# Altium footprint library c3_PcbLib.PcbLib: 222 footprints (part 9 of 14)
Each footprint in its own frame and in the unit in brackets; x right, y up, seen from the top. Pads: shape width x height; smd on the part's side, far side on the other; paste and mask are expansions set on the pad; w line width, h text height; cw(c..) or ccw(c..) is an arc to the next point about the centre after c.
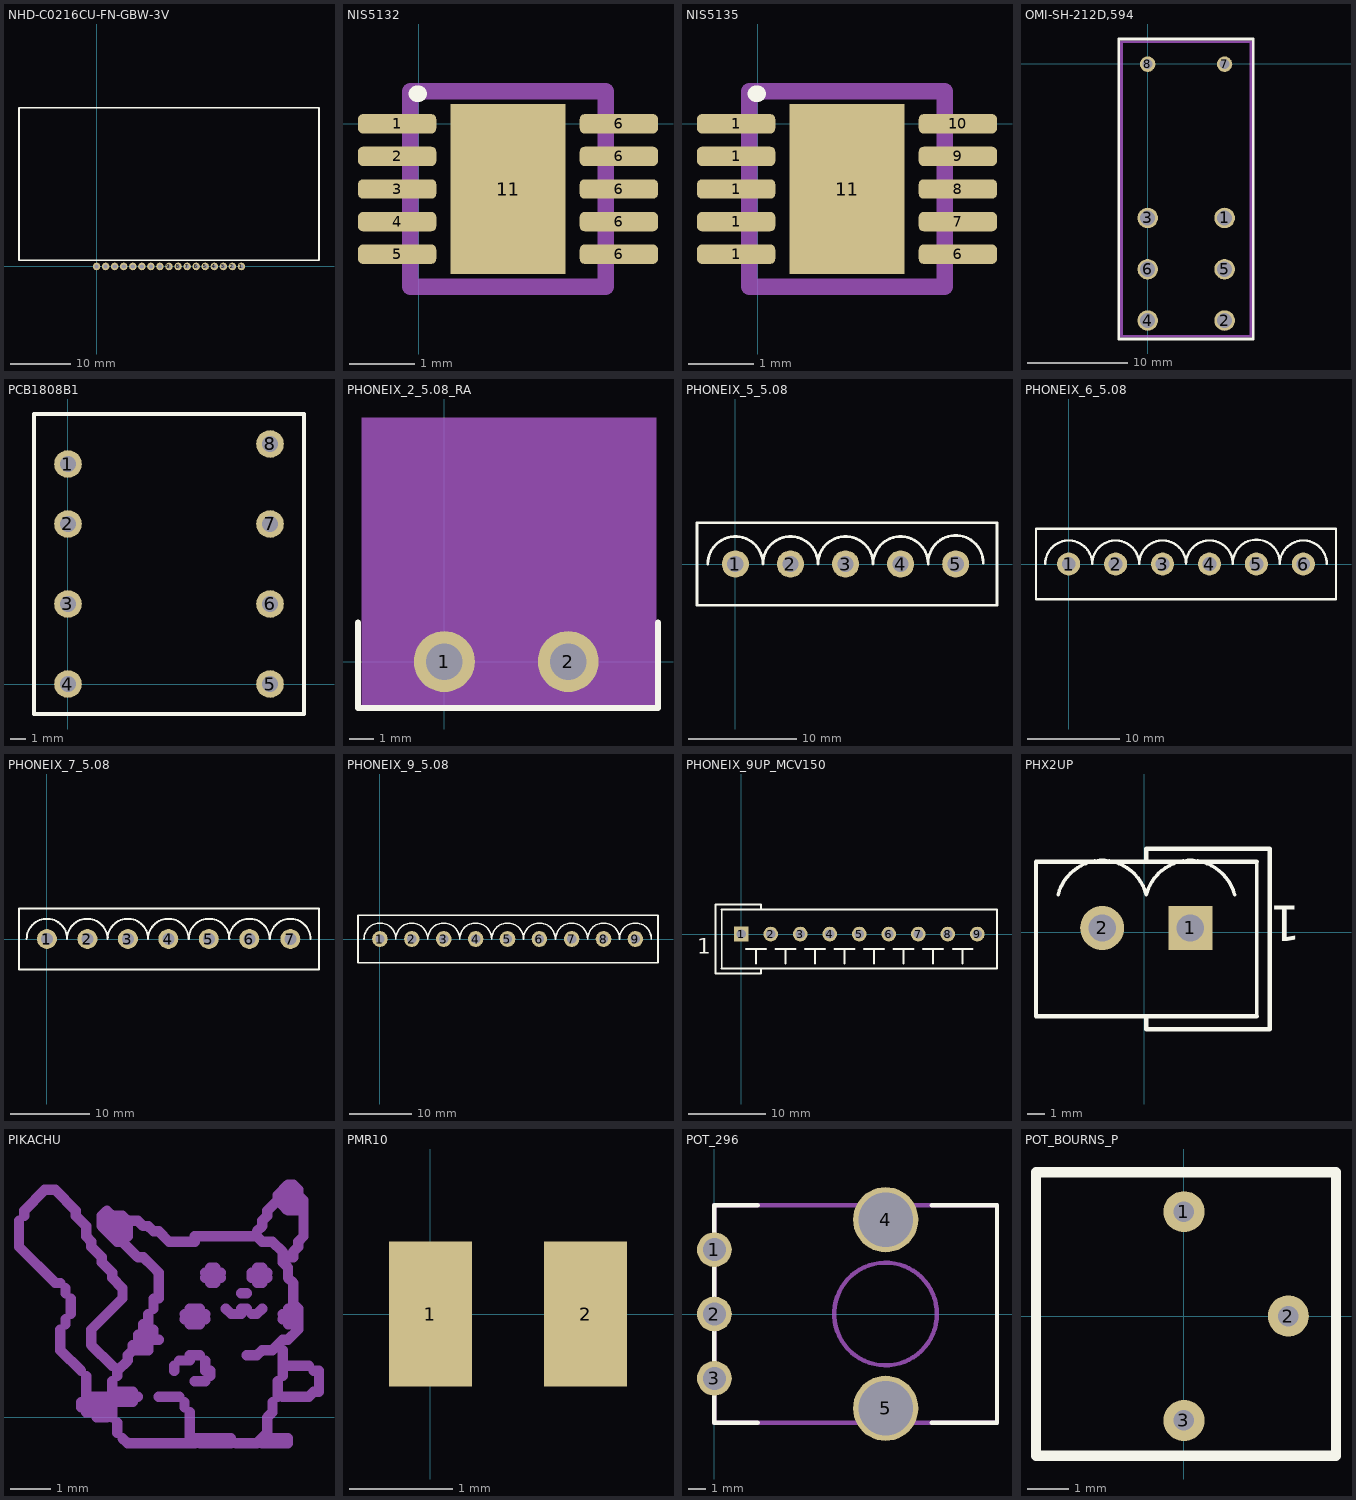
[diagram p8: the footprints below, top view; thin cyan lines are the x and y axes]

## NHD-C0216CU-FN-GBW-3V [mm]
pads (17):
  round 1.25 hole 0.7: 1(24,0) 2(22.5,0) 3(21,0) 4(19.5,0) 5(18,0) 6(16.5,0) 7(15,0) 8(13.5,0) 9(12,0) 10(10.5,0) 11(9,0) 12(7.5,0) 13(6,0) 14(4.5,0) 15(3,0) 16(1.5,0) 17(0,0)
Top Overlay:
  lines w0.254: -12.85,1 36.85,1 36.85,26.3 -12.85,26.3 -12.85,1
3D body: height 2, standoff 0, extent -12.827,1.041 36.83,26.289

## NIS5132 [mm]
pads (11):
  rrect50% 1.2x0.297 smd: 1(-0.33,0) 2(-0.33,-0.5) 3(-0.33,-1) 4(-0.33,-1.5) 5(-0.33,-2) 6(3.07,-2) 6(3.07,-1.5) 6(3.07,-1) 6(3.07,-0.5) 6(3.07,0)
  rect 1.768x2.6 smd: 11(1.37,-1)
Top Overlay:
  lines w0.254: -0.025,0.457 0,0.457
Mechanical 13:
  lines w0.254: -0.13,-2.5 -0.13,0.5 2.87,0.5 2.87,-2.5 -0.13,-2.5
3D body: height 1, standoff 0, extent -0.13,-2.499 2.869,0.499

## NIS5135 [mm]
pads (11):
  rrect50% 1.2x0.297 smd: 1(-0.33,-2) 1(-0.33,-1.5) 1(-0.33,-1) 1(-0.33,-0.5) 1(-0.33,0) 6(3.07,-2) 7(3.07,-1.5) 8(3.07,-1) 9(3.07,-0.5) 10(3.07,0)
  rect 1.768x2.6 smd: 11(1.37,-1)
Top Overlay:
  lines w0.254: -0.025,0.457 0,0.457
Mechanical 13:
  lines w0.254: -0.13,-2.5 2.87,-2.5 2.87,0.5 -0.13,0.5 -0.13,-2.5
3D body: height 1, standoff 0, extent -0.13,-2.499 2.869,0.499

## OMI-SH-212D,594 [mil]
pads (8):
  round 80 hole 59: 1(299.57,-600.99) 2(299.57,-1000.99) 3(-0.43,-600.99) 4(-0.43,-1000.99) 5(299.57,-800.99) 6(-0.43,-800.99)
  round 60 hole 39: 7(299.57,-0.99) 8(-0.43,-0.99)
Top Overlay:
  lines w10: -113.43,-1072.99 411.57,-1072.99 411.57,97.01 -113.43,97.01 -113.43,-1072.99
Mechanical 1:
  lines w10: -102.43,-1062.99 401.57,-1062.99 401.57,87.01 -102.43,87.01 -102.43,-1062.99
3D body: height 0, standoff -157, extent 280.07,-606.99 319.07,-594.99
3D body: height 0, standoff -157, extent 280.07,-806.99 319.07,-794.99
3D body: height 0, standoff -157, extent 280.07,-1006.99 319.07,-994.99
3D body: height 0, standoff -157, extent -19.93,-1006.99 19.07,-994.99
3D body: height 0, standoff -157, extent -19.93,-806.99 19.07,-794.99
3D body: height 0, standoff -157, extent -19.93,-606.99 19.07,-594.99
3D body: height 0, standoff -157, extent 287.58,-12.99 311.58,11.01
3D body: height 0, standoff -157, extent -12.42,-12.99 11.58,11.01
3D body: height 811, standoff 0, extent -102.43,-1062.99 401.57,87.01

## PCB1808B1 [mm]
pads (8):
  round 1.75 hole 1: 1(0,13.97) 2(0,10.16) 3(0,5.08) 4(0,0) 5(12.83,0) 6(12.83,5.08) 7(12.83,10.16) 8(12.83,15.24)
Top Overlay:
  lines w0.254: 15,-1.905 -2.17,-1.905 -2.17,17.145 15,17.145 15,-1.9
3D body: height 15.89, standoff -4.34, extent -1.93,-2.035 14.73,17.2

## PHONEIX_2_5.08_RA [mm]
height 15
pads (2):
  round 2.5 hole 1.5: 1(0,0) 2(5.08,0)
Top Overlay:
  lines w0.254: -3.54,-1.9 -3.54,1.6 ; -3.5,-1.9 8.7,-1.9 ; 8.76,-1.9 8.76,1.6
Mechanical 1:
  rectangle: -3.4,-2 8.7,10

## PHONEIX_5_5.08 [mm]
pads (5):
  round 2.5 hole 1.5: 1(0,0) 2(5.08,0) 3(10.16,0) 4(15.24,0) 5(20.32,0)
Top Overlay:
  lines w0.254: -2.54,0 cw(c0,0) 2.54,0 cw(c5.08,0) 7.62,0 cw(c10.16,0) 12.7,0 cw(c15.24,0) 17.78,0 ; 17.78,0.1 cw(c20.32,0.1) 22.86,0.1 ; -3.54,-3.8 24.13,-3.8 24.13,3.8 -3.54,3.8 -3.54,-3.8
3D body: height 12, standoff -3.9, extent -3.524,-4.815 23.876,3.785

## PHONEIX_6_5.08 [mm]
pads (6):
  round 2.5 hole 1.5: 1(0,0) 2(5.08,0) 3(10.16,0) 4(15.24,0) 5(20.32,0) 6(25.4,0)
Top Overlay:
  lines w0.254: -2.54,0 cw(c0,0) 2.54,0 cw(c5.08,0) 7.62,0 cw(c10.16,0) 12.7,0 cw(c15.24,0) 17.78,0 ; 17.78,0.1 cw(c20.32,0.1) 22.86,0.1 ; 22.86,0 cw(c25.4,0) 27.94,0 ; -3.54,-3.8 -3.54,3.8 28.94,3.8 28.94,-3.8 -3.54,-3.8
3D body: height 12, standoff -3.9, extent -3.529,-4.803 28.951,3.797

## PHONEIX_7_5.08 [mm]
pads (7):
  round 2.5 hole 1.5: 1(0,0) 2(5.08,0) 3(10.16,0) 4(15.24,0) 5(20.32,0) 6(25.4,0) 7(30.54,0)
Top Overlay:
  lines w0.254: -2.54,0 cw(c0,0) 2.54,0 ; 2.52,0 cw(c5.06,0) 7.6,0 ; 7.62,0 cw(c10.16,0) 12.7,0 cw(c15.24,0) 17.78,0 ; 17.8,0 cw(c20.34,0) 22.88,0 ; 22.86,0 cw(c25.4,0) 27.94,0 ; 28,0 cw(c30.54,0) 33.08,0 ; -3.5,-1.9 -3.5,-1.9 ; -3.5,-1.9 -3.5,-3.8 34.14,-3.8 34.14,3.8 -3.5,3.8 -3.5,1.9 ; -3.5,-1.9 -3.5,-0.95 -3.5,0.95 -3.5,1.9 ; -3.5,1.9 -3.5,1.9
3D body: height 12, standoff -3.9, extent -3.56,-4.8 34,3.8

## PHONEIX_9_5.08 [mm]
pads (9):
  round 2.5 hole 1.5: 1(0,0) 2(5.08,0) 3(10.16,0) 4(15.24,0) 5(20.32,0) 6(25.4,0) 7(30.54,0) 8(35.62,0) 9(40.7,0)
Top Overlay:
  lines w0.254: -2.54,0 cw(c0,0) 2.54,0 ; 2.52,0 cw(c5.06,0) 7.6,0 ; 7.62,0 cw(c10.16,0) 12.7,0 cw(c15.24,0) 17.78,0 ; 17.8,0 cw(c20.34,0) 22.88,0 ; 22.86,0 cw(c25.4,0) 27.94,0 ; 28,0 cw(c30.54,0) 33.08,0 ; 33.1,0 cw(c35.64,0) 38.18,0 ; 38.16,0 cw(c40.7,0) 43.24,0 ; -3.5,-1.9 -3.5,-1.9 ; -3.5,-1.9 -3.5,-3.8 44.3,-3.8 44.3,-1.74 44.3,1.74 44.3,3.8 -3.5,3.8 -3.5,1.9 ; -3.5,-1.9 -3.5,-0.95 -3.5,0.95 -3.5,1.9 ; -3.5,1.9 -3.5,1.9
3D body: height 12, standoff -3.9, extent -3.569,-4.803 44.151,3.797

## PHONEIX_9UP_MCV150 [mil] "9 pin Phoneix conector"
height 100
pads (9):
  rect 75x75 hole 47: 1(0,0)
  round 75 hole 47: 2(150,0) 3(300,0) 4(450,0) 5(600,0) 6(750,0) 7(900,0) 8(1050,0) 9(1200,0)
Top Overlay:
  lines w8: -100,-175 -100,125 ; 1300,-175 1300,125
  lines w10: -100,-175 1300,-175 ; -100,125 1300,125 ; 25,-75 125,-75 ; 75,-150 75,-75 ; 100,-175 100,-200 -130,-200 -130,150 100,150 100,130 ; 175,-75 275,-75 ; 225,-150 225,-75 ; 325,-75 425,-75 ; 375,-150 375,-75 ; 475,-75 575,-75 ; 525,-150 525,-75 ; 625,-75 725,-75 ; 675,-150 675,-75 ; 775,-75 875,-75 ; 825,-150 825,-75 ; 925,-75 1025,-75 ; 975,-150 975,-75 ; 1075,-75 1175,-75 ; 1125,-150 1125,-75
  text "1" at -225,-100 h80

## PHX2UP [mil]
pads (2):
  rect 100x100 hole 62: 1(105,10)
  round 100 hole 62: 2(-95,10)
Top Overlay:
  lines w8: -245,-190 -245,160 ; -195.02,84.94 cw(c-95,60) 5.02,84.94 cw(c105,60) 205.02,84.94 ; 255,-190 255,160
  lines w10: -245,-190 255,-190 ; -245,160 255,160 ; 5,-190 5,-220 285,-220 285,190 275,190 5,190 5,160
  text "1" at 355,60 h80
3D body: height 472.44, standoff -153.54, extent -234.37,-178.58 244.37,160

## PIKACHU [mm]
Bottom Overlay:
  drawing of 362 lines, arcs and shapes, not listed

## PMR10 [mm]
pads (2):
  rect 0.8x1.4 smd: 1(0,0) 2(1.5,0)

## POT_296 [mil]
pads (5):
  round 80 hole 53: 1(0,148) 2(0,0) 3(0,-148)
  round 150 hole 125: 4(394,217) 5(394,-217)
Top Overlay:
  lines w10: 100,-250 0,-250 0,250 100,250 ; 500,-250 650,-250 650,250 500,250
Mechanical 13:
  circle w10: c393.7,0 r118.11
  lines w10: 0,-250 650,-250 650,0 650,250 0,250 0,-250
3D body: height 342, standoff 0, extent 0.02,-249.98 649.98,249.98
3D body: height 800, standoff 0, extent 275.25,-118.46 512.16,118.46

## POT_BOURNS_P [mm]
height 4.7
pads (3):
  round 1 hole 0.5: 1(0,2.54) 2(2.54,0) 3(0,-2.54)
Top Overlay:
  lines w0.254: -3.6,-3.4 3.7,-3.4 3.7,3.5 -3.6,3.5 -3.6,-3.4